# Altium footprint library Tomra_Cadstar_Footprints.PcbLib: 373 footprints (part 11 of 24)
Each footprint in its own frame and in the unit in brackets; x right, y up, seen from the top. Pads: shape width x height; smd on the part's side, far side on the other; paste and mask are expansions set on the pad; w line width, h text height; cw(c..) or ccw(c..) is an arc to the next point about the centre after c.
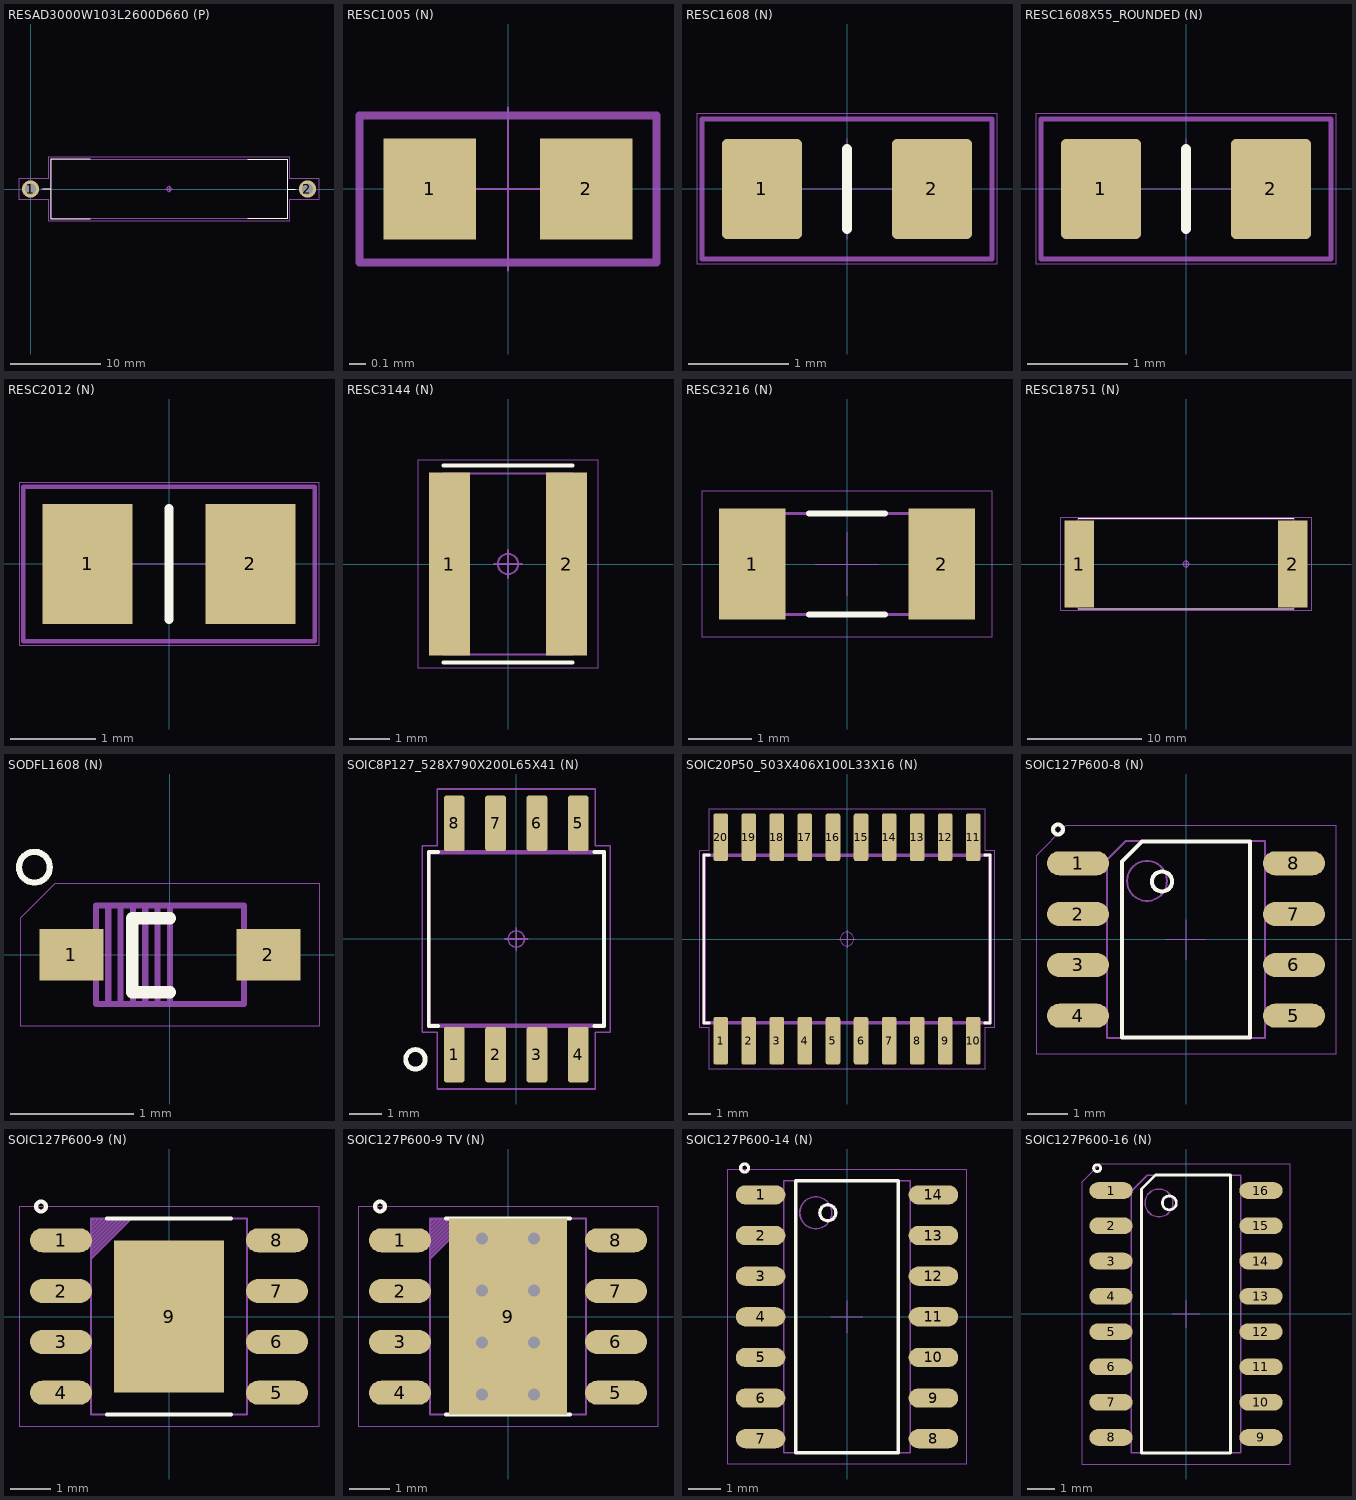
[diagram p10: the footprints below, top view; thin cyan lines are the x and y axes]

## RESAD3000W103L2600D660 (P) [mm]
height 8
pads (2):
  round 1.9 / inner round 1.524 / far side round 1.9 hole 1.25 paste+0 mask+0: 1(0,0) 2(30.48,0)
Top Silk:
  lines w0.1: 1.37,0 2.24,0 ; 6.57,-3.3 2.24,-3.3 2.24,3.3 6.57,3.3 ; 23.91,-3.3 28.24,-3.3 28.24,3.3 23.91,3.3 ; 28.24,0 29.11,0
  text ".Designator" at 2.24,3.3 h0.7
Top Assembly:
  lines w0.05: 1.19,0 2.24,0 ; 28.24,0 29.29,0 ; 2.24,-3.3 2.24,3.3 28.24,3.3 28.24,-3.3 2.24,-3.3
Top Placement:
  lines w0.01: -1.27,-1.2 -1.27,1.2 1.99,1.2 1.99,3.56 28.49,3.56 28.49,1.2 31.75,1.2 31.75,-1.2 28.49,-1.2 28.49,-3.56 1.99,-3.56 1.99,-1.2 -1.27,-1.2
  lines w0.05: 14.89,0 15.59,0 ; 15.24,-0.35 15.24,0.35 ; 14.99,0 cw(c15.24,0) 15.49,0 cw(c15.24,0) 14.99,0

## RESC1005 (N) [mm]
height 0.4
pads (2):
  rect 0.57x0.62 smd paste+0 mask+0: 1(-0.48,0) 2(0.48,0)
Top Silk:
  text ".Designator" at -3.599,-0.35 h0.7
Top Assembly:
  lines w0.05: -0.91,-0.45 0.91,-0.45 0.91,0.45 -0.91,0.45 -0.91,-0.45
Top Placement:
  lines w0.01: -0.5,0 0.5,0 ; 0,-0.5 0,0.5 ; -0.92,-0.46 0.92,-0.46 0.92,0.46 -0.92,0.46 -0.92,-0.46

## RESC1608 (N) [mm]
height 0.84
pads (2):
  rrect12% 0.8x1 smd paste+0 mask+0: 1(-0.85,0) 2(0.85,0)
Top Silk:
  lines w0.1: 0,-0.4 0,0.4
Top Assembly:
  lines w0.05: -1.45,-0.7 1.45,-0.7 1.45,0.7 -1.45,0.7 -1.45,-0.7
Top Placement:
  lines w0.01: -0.5,0 0.5,0 ; 0,-0.5 0,0.5 ; -1.5,-0.75 1.5,-0.75 1.5,0.75 -1.5,0.75 -1.5,-0.75

## RESC1608X55_ROUNDED (N) [mm]
height 0.55
pads (2):
  rrect12% 0.8x1 smd paste+0 mask+0: 1(-0.85,0) 2(0.85,0)
Top Silk:
  lines w0.1: 0,-0.4 0,0.4
Top Assembly:
  lines w0.05: -1.45,-0.7 1.45,-0.7 1.45,0.7 -1.45,0.7 -1.45,-0.7
Top Placement:
  lines w0.01: -0.5,0 0.5,0 ; 0,-0.5 0,0.5 ; -1.5,-0.75 1.5,-0.75 1.5,0.75 -1.5,0.75 -1.5,-0.75

## RESC2012 (N) [mm]
height 0.7
pads (2):
  rect 1.05x1.4 smd paste+0 mask+0: 1(-0.95,0) 2(0.95,0)
Top Silk:
  lines w0.1: 0,-0.65 0,0.65
  text ".Designator" at -3.599,-0.35 h0.7
Top Assembly:
  lines w0.05: -1.7,-0.9 1.7,-0.9 1.7,0.9 -1.7,0.9 -1.7,-0.9
Top Placement:
  lines w0.01: -0.5,0 0.5,0 ; 0,-0.5 0,0.5 ; -1.75,-0.95 1.75,-0.95 1.75,0.95 -1.75,0.95 -1.75,-0.95

## RESC3144 (N) [mm]
height 0.65
pads (2):
  rect 1.02x4.53 smd paste+0 mask+0: 1(-1.455,0) 2(1.455,0)
Top Silk:
  lines w0.1: -1.6,-2.445 1.6,-2.445 ; -1.6,2.445 1.6,2.445
  text ".Designator" at 0,0 h0.7
Top Assembly:
  lines w0.05: -1.6,-2.25 -1.6,2.25 1.6,2.25 1.6,-2.25 -1.6,-2.25
Top Placement:
  lines w0.01: -2.22,-2.58 -2.22,2.58 2.22,2.58 2.22,-2.58 -2.22,-2.58
  lines w0.05: -0.35,0 0.35,0 ; 0,-0.35 0,0.35 ; -0.25,0 cw(c0,0) 0.25,0 cw(c0,0) -0.25,0

## RESC3216 (N) [mm]
height 0.84
pads (2):
  rect 1.05x1.75 smd paste+0 mask+0: 1(-1.5,0) 2(1.5,0)
Top Silk:
  lines w0.1: -0.6,-0.8 0.6,-0.8 ; -0.6,0.8 0.6,0.8
  text ".Designator" at -3.599,-0.35 h0.7
Top Assembly:
  lines w0.05: -1.6,-0.8 1.6,-0.8 1.6,0.8 -1.6,0.8 -1.6,-0.8
Top Placement:
  lines w0.01: -0.5,0 0.5,0 ; 0,-0.5 0,0.5 ; -2.3,-1.15 2.3,-1.15 2.3,1.15 -2.3,1.15 -2.3,-1.15

## RESC18751 (N) [mm]
height 6.9
pads (2):
  rect 2.6x7.6 smd paste+0 mask+0: 1(-9.35,0) 2(9.35,0)
Top Silk:
  lines w0.1: -9.45,-3.98 9.45,-3.98 ; -9.45,3.98 9.45,3.98
  text ".Designator" at 0,0 h0.7
Top Assembly:
  lines w0.05: -9.45,-3.98 -9.45,3.98 9.45,3.98 9.45,-3.98 -9.45,-3.98
Top Placement:
  lines w0.01: -11,-4.11 -11,4.11 11,4.11 11,-4.11 -11,-4.11
  lines w0.05: -0.35,0 0.35,0 ; 0,-0.35 0,0.35 ; -0.25,0 cw(c0,0) 0.25,0 cw(c0,0) -0.25,0

## SODFL1608 (N) [mm]
pads (2):
  rect 0.52x0.42 smd paste+0 mask+0: 1(-0.8,0) 2(0.8,0)
Top Silk:
  lines w0.05: -1.225,0.71 cw(c-1.1,0.71) -0.975,0.71 cw(c-1.1,0.71) -1.225,0.71
  lines w0.1: 0,-0.305 -0.305,-0.305 -0.305,0.295 0,0.295
  text ".Designator" at 0,0 h0.7
Top Assembly:
  lines w0.05: -0.5,-0.4 -0.5,0.4 ; -0.4,-0.4 -0.4,0.4 ; -0.3,-0.4 -0.3,0.4 ; -0.2,-0.4 -0.2,0.4 ; -0.1,-0.4 -0.1,0.4 ; 0,-0.4 0,0.4 ; -0.6,-0.4 -0.6,0.4 0.6,0.4 0.6,-0.4 -0.6,-0.4
Top Placement:
  lines w0.01: -1.21,-0.58 -1.21,0.3 -0.93,0.58 1.21,0.58 1.21,-0.58 -1.21,-0.58

## SOIC8P127_528X790X200L65X41 (N) [mm]
height 2
pads (8):
  rrect25% 0.64x1.71 smd paste+0 mask+0: 1(-1.905,-3.555) 2(-0.635,-3.555) 3(0.635,-3.555) 4(1.905,-3.555) 5(1.905,3.555) 6(0.635,3.555) 7(-0.635,3.555) 8(-1.905,3.555)
Top Silk:
  lines w0.12: -2.405,-2.67 -2.69,-2.67 -2.69,2.67 -2.405,2.67 ; 2.405,-2.67 2.69,-2.67 2.69,2.67 2.405,2.67
  lines w0.15: -3.1,-4 cw(c-3.1,-3.7) -3.1,-3.4 cw(c-3.1,-3.7) -3.1,-4
  text ".Designator" at -4.319,-0.42 h0.84
Top Assembly:
  lines w0.12: -2.69,-2.67 -2.69,2.67 2.69,2.67 2.69,-2.67 -2.69,-2.67
Top Placement:
  lines w0.05: -0.35,0 0.35,0 ; 0,-0.35 0,0.35 ; -2.89,-2.87 -2.89,2.87 -2.425,2.87 -2.425,4.61 2.425,4.61 2.425,2.87 2.89,2.87 2.89,-2.87 2.425,-2.87 2.425,-4.61 -2.425,-4.61 -2.425,-2.87 -2.89,-2.87 ; -0.25,0 cw(c0,0) 0.25,0 cw(c0,0) -0.25,0
Top 3D Model Outline:
  lines w0.025: -2.64,-2.615 -2.64,2.615 2.64,2.615 2.64,-2.615 -2.64,-2.615 ; -2.113,-3.95 -1.697,-3.95 -1.697,-3.3 -2.113,-3.3 -2.113,-3.95 ; -2.113,3.3 -1.697,3.3 -1.697,3.95 -2.113,3.95 -2.113,3.3 ; -0.843,-3.95 -0.427,-3.95 -0.427,-3.3 -0.843,-3.3 -0.843,-3.95 ; -0.843,3.3 -0.427,3.3 -0.427,3.95 -0.843,3.95 -0.843,3.3 ; 0.427,-3.95 0.843,-3.95 0.843,-3.3 0.427,-3.3 0.427,-3.95 ; 0.427,3.3 0.843,3.3 0.843,3.95 0.427,3.95 0.427,3.3 ; 1.697,-3.95 2.113,-3.95 2.113,-3.3 1.697,-3.3 1.697,-3.95 ; 1.697,3.3 2.113,3.3 2.113,3.95 1.697,3.95 1.697,3.3

## SOIC20P50_503X406X100L33X16 (N) [mil]
height 100
pads (20):
  rrect25% 26x84.4 smd paste+0 mask+0: 1(-225,-181.2) 2(-175,-181.2) 3(-125,-181.2) 4(-75,-181.2) 5(-25,-181.2) 6(25,-181.2) 7(75,-181.2) 8(125,-181.2) 9(175,-181.2) 10(225,-181.2) 11(225,181.2) 12(175,181.2) 13(125,181.2) 14(75,181.2) 15(25,181.2) 16(-25,181.2) 17(-75,181.2) 18(-125,181.2) 19(-175,181.2) 20(-225,181.2)
Top Silk:
  lines w4.7: -245.2,-149.6 -255.2,-149.6 -255.2,149.6 -245.2,149.6 ; 245.2,-149.6 255.2,-149.6 255.2,149.6 245.2,149.6
  text ".Designator" at -170.15,-16.52 h33.04
Drill:
  lines w1: -251.5,-147.75 -251.5,147.75 251.5,147.75 251.5,-147.75 -251.5,-147.75 ; -233.25,-203.25 -216.75,-203.25 -216.75,-170.25 -233.25,-170.25 -233.25,-203.25 ; -233.25,170.25 -216.75,170.25 -216.75,203.25 -233.25,203.25 -233.25,170.25 ; -183.25,-203.25 -166.75,-203.25 -166.75,-170.25 -183.25,-170.25 -183.25,-203.25 ; -183.25,170.25 -166.75,170.25 -166.75,203.25 -183.25,203.25 -183.25,170.25 ; -133.25,-203.25 -116.75,-203.25 -116.75,-170.25 -133.25,-170.25 -133.25,-203.25 ; -133.25,170.25 -116.75,170.25 -116.75,203.25 -133.25,203.25 -133.25,170.25 ; -83.25,-203.25 -66.75,-203.25 -66.75,-170.25 -83.25,-170.25 -83.25,-203.25 ; -83.25,170.25 -66.75,170.25 -66.75,203.25 -83.25,203.25 -83.25,170.25 ; -33.25,-203.25 -16.75,-203.25 -16.75,-170.25 -33.25,-170.25 -33.25,-203.25 ; -33.25,170.25 -16.75,170.25 -16.75,203.25 -33.25,203.25 -33.25,170.25 ; 16.75,-203.25 33.25,-203.25 33.25,-170.25 16.75,-170.25 16.75,-203.25 ; 16.75,170.25 33.25,170.25 33.25,203.25 16.75,203.25 16.75,170.25 ; 66.75,-203.25 83.25,-203.25 83.25,-170.25 66.75,-170.25 66.75,-203.25 ; 66.75,170.25 83.25,170.25 83.25,203.25 66.75,203.25 66.75,170.25 ; 116.75,-203.25 133.25,-203.25 133.25,-170.25 116.75,-170.25 116.75,-203.25 ; 116.75,170.25 133.25,170.25 133.25,203.25 116.75,203.25 116.75,170.25 ; 166.75,-203.25 183.25,-203.25 183.25,-170.25 166.75,-170.25 166.75,-203.25 ; 166.75,170.25 183.25,170.25 183.25,203.25 166.75,203.25 166.75,170.25 ; 216.75,-203.25 233.25,-203.25 233.25,-170.25 216.75,-170.25 216.75,-203.25 ; 216.75,170.25 233.25,170.25 233.25,203.25 216.75,203.25 216.75,170.25
Top Assembly:
  lines w4.7: -255.2,-149.6 -255.2,149.6 255.2,149.6 255.2,-149.6 -255.2,-149.6
Top Placement:
  lines w2: -16,0 16,0 ; 0,-16 0,16 ; -263.2,-157.6 -263.2,157.6 -245.9,157.6 -245.9,231.3 245.9,231.3 245.9,157.6 263.2,157.6 263.2,-157.6 245.9,-157.6 245.9,-231.3 -245.9,-231.3 -245.9,-157.6 -263.2,-157.6 ; -12,0 cw(c0,0) 12,0 cw(c0,0) -12,0

## SOIC127P600-8 (N) [mm]
height 1.8
pads (8):
  oval 1.55x0.6 smd paste+0 mask+0: 1(-2.7,1.905) 2(-2.7,0.635) 3(-2.7,-0.635) 4(-2.7,-1.905) 5(2.7,-1.905) 6(2.7,-0.635) 7(2.7,0.635) 8(2.7,1.905)
Top Silk:
  lines w0.1: -3.325,2.75 cw(c-3.2,2.75) -3.075,2.75 cw(c-3.2,2.75) -3.325,2.75 ; -1.6,-2.45 1.6,-2.45 1.6,2.45 -1.1,2.45 -1.6,1.95 -1.6,-2.45 ; -0.85,1.45 cw(c-0.6,1.45) -0.35,1.45 cw(c-0.6,1.45) -0.85,1.45
  text ".Designator" at 0,0 h0.7
Top Assembly:
  lines w0.05: -1.975,-2.465 1.975,-2.465 1.975,2.465 -1.5,2.465 -1.975,1.99 -1.975,-2.465 ; -1.475,1.465 cw(c-0.975,1.465) -0.475,1.465 cw(c-0.975,1.465) -1.475,1.465
Top Placement:
  lines w0.01: -0.5,0 0.5,0 ; 0,-0.5 0,0.5 ; -3.75,-2.85 3.75,-2.85 3.75,2.85 -3,2.85 -3.75,2.1 -3.75,-2.85

## SOIC127P600-9 (N) [mm]
height 1.75
pads (9):
  oval 1.55x0.6 smd paste+0 mask+0: 1(-2.7,1.905) 2(-2.7,0.635) 3(-2.7,-0.635) 4(-2.7,-1.905) 5(2.7,-1.905) 6(2.7,-0.635) 7(2.7,0.635) 8(2.7,1.905)
  rect 2.75x3.8 smd paste+0 mask+0: 9(0,0)
Top Silk:
  lines w0.1: -1.55,-2.45 1.55,-2.45 ; -1.55,2.45 1.55,2.45 ; -3.325,2.75 cw(c-3.2,2.75) -3.075,2.75 cw(c-3.2,2.75) -3.325,2.75
  text ".Designator" at -3.599,-0.35 h0.7
Top Assembly:
  lines w0.05: -1.95,1.45 -0.95,2.45 ; -1.95,1.55 -1.05,2.45 ; -1.95,1.65 -1.15,2.45 ; -1.95,1.75 -1.25,2.45 ; -1.95,1.85 -1.35,2.45 ; -1.95,1.95 -1.45,2.45 ; -1.95,2.05 -1.55,2.45 ; -1.95,2.15 -1.65,2.45 ; -1.95,2.25 -1.75,2.45 ; -1.95,2.35 -1.85,2.45 ; -1.95,-2.45 1.95,-2.45 1.95,2.45 -1.95,2.45 -1.95,-2.45
Top Placement:
  lines w0.01: -0.5,0 0.5,0 ; 0,-0.5 0,0.5 ; -3.75,-2.75 3.75,-2.75 3.75,2.75 -3.75,2.75 -3.75,-2.75

## SOIC127P600-9 TV (N) [mm]
height 1.7
pads (17):
  oval 1.55x0.6 smd paste+0 mask+0: 1(-2.7,1.905) 2(-2.7,0.635) 3(-2.7,-0.635) 4(-2.7,-1.905) 5(2.7,-1.905) 6(2.7,-0.635) 7(2.7,0.635) 8(2.7,1.905)
  rect 2.95x4.9 smd paste+0 mask+0: 9(0,0)
  round 0 / inner round 1.524 / far side round 0 hole 0.3 paste+0 mask+0: 10(-0.65,-1.95) 11(0.65,-1.95) 12(0.65,-0.65) 13(-0.65,-0.65) 14(-0.65,0.65) 15(0.65,0.65) 16(0.65,1.95) 17(-0.65,1.95)
Top Elec:
  region: 0.4,-2.2 0.8,-2.2 0.8,-0.5 0.4,-0.5
  region: 0.4,-0.8 0.8,-0.8 0.8,0.9 0.4,0.9
  region: 0.4,0.5 0.8,0.5 0.8,2.2 0.4,2.2
  region: 0.8,1.8 0.8,2.2 -0.9,2.2 -0.9,1.8
  region: -0.9,0.5 -0.5,0.5 -0.5,2.2 -0.9,2.2
  region: 0.3,-0.4 0.3,1 -1,1 -1,-0.4
  region: -0.9,-2.2 -0.5,-2.2 -0.5,-0.5 -0.9,-0.5
  region: -0.9,-0.8 -0.5,-0.8 -0.5,0.9 -0.9,0.9
Top Silk:
  lines w0.1: -1.55,-2.45 1.55,-2.45 ; -1.55,2.45 1.55,2.45 ; -3.325,2.75 cw(c-3.2,2.75) -3.075,2.75 cw(c-3.2,2.75) -3.325,2.75
  text ".Designator" at -3.599,-0.35 h0.7
Top Assembly:
  lines w0.05: -1.95,1.45 -0.95,2.45 ; -1.95,1.55 -1.05,2.45 ; -1.95,1.65 -1.15,2.45 ; -1.95,1.75 -1.25,2.45 ; -1.95,1.85 -1.35,2.45 ; -1.95,1.95 -1.45,2.45 ; -1.95,2.05 -1.55,2.45 ; -1.95,2.15 -1.65,2.45 ; -1.95,2.25 -1.75,2.45 ; -1.95,2.35 -1.85,2.45 ; -1.95,-2.45 1.95,-2.45 1.95,2.45 -1.95,2.45 -1.95,-2.45
Top Placement:
  lines w0.01: -0.5,0 0.5,0 ; 0,-0.5 0,0.5 ; -3.75,-2.75 3.75,-2.75 3.75,2.75 -3.75,2.75 -3.75,-2.75

## SOIC127P600-14 (N) [mm]
height 1.8
pads (14):
  oval 1.55x0.6 smd paste+0 mask+0: 1(-2.7,3.81) 2(-2.7,2.54) 3(-2.7,1.27) 4(-2.7,0) 5(-2.7,-1.27) 6(-2.7,-2.54) 7(-2.7,-3.81) 8(2.7,-3.81) 9(2.7,-2.54) 10(2.7,-1.27) 11(2.7,0) 12(2.7,1.27) 13(2.7,2.54) 14(2.7,3.81)
Top Silk:
  lines w0.1: -3.325,4.65 cw(c-3.2,4.65) -3.075,4.65 cw(c-3.2,4.65) -3.325,4.65 ; -1.6,-4.25 1.6,-4.25 1.6,4.25 -1.6,4.25 -1.6,-4.25 ; -0.85,3.25 cw(c-0.6,3.25) -0.35,3.25 cw(c-0.6,3.25) -0.85,3.25
  text ".Designator" at -3.599,-0.35 h0.7
Top Assembly:
  lines w0.05: -1.975,-4.25 1.975,-4.25 1.975,4.25 -1.975,4.25 -1.975,-4.25 ; -1.475,3.25 cw(c-0.975,3.25) -0.475,3.25 cw(c-0.975,3.25) -1.475,3.25
Top Placement:
  lines w0.01: -0.5,0 0.5,0 ; 0,-0.5 0,0.5 ; -3.75,-4.6 3.75,-4.6 3.75,4.6 -3.75,4.6 -3.75,-4.6

## SOIC127P600-16 (N) [mm]
height 1.8
pads (16):
  oval 1.55x0.6 smd paste+0 mask+0: 1(-2.7,4.445) 2(-2.7,3.175) 3(-2.7,1.905) 4(-2.7,0.635) 5(-2.7,-0.635) 6(-2.7,-1.905) 7(-2.7,-3.175) 8(-2.7,-4.445) 9(2.7,-4.445) 10(2.7,-3.175) 11(2.7,-1.905) 12(2.7,-0.635) 13(2.7,0.635) 14(2.7,1.905) 15(2.7,3.175) 16(2.7,4.445)
Top Silk:
  lines w0.1: -3.325,5.25 cw(c-3.2,5.25) -3.075,5.25 cw(c-3.2,5.25) -3.325,5.25 ; -1.6,-5 1.6,-5 1.6,5 -1.1,5 -1.6,4.5 -1.6,-5 ; -0.85,4 cw(c-0.6,4) -0.35,4 cw(c-0.6,4) -0.85,4
  text ".Designator" at 0,0 h0.7
Top Assembly:
  lines w0.05: -1.975,-5 1.975,-5 1.975,5 -1.4,5 -1.975,4.425 -1.975,-5 ; -1.475,4 cw(c-0.975,4) -0.475,4 cw(c-0.975,4) -1.475,4
Top Placement:
  lines w0.01: -0.5,0 0.5,0 ; 0,-0.5 0,0.5 ; -3.75,-5.4 3.75,-5.4 3.75,5.4 -3.1,5.4 -3.75,4.75 -3.75,-5.4